# Altium footprint library MS-Electronic.PcbLib: 202 footprints (part 6 of 13)
Each footprint in its own frame and in the unit in brackets; x right, y up, seen from the top. Pads: shape width x height; smd on the part's side, far side on the other; paste and mask are expansions set on the pad; w line width, h text height; cw(c..) or ccw(c..) is an arc to the next point about the centre after c.
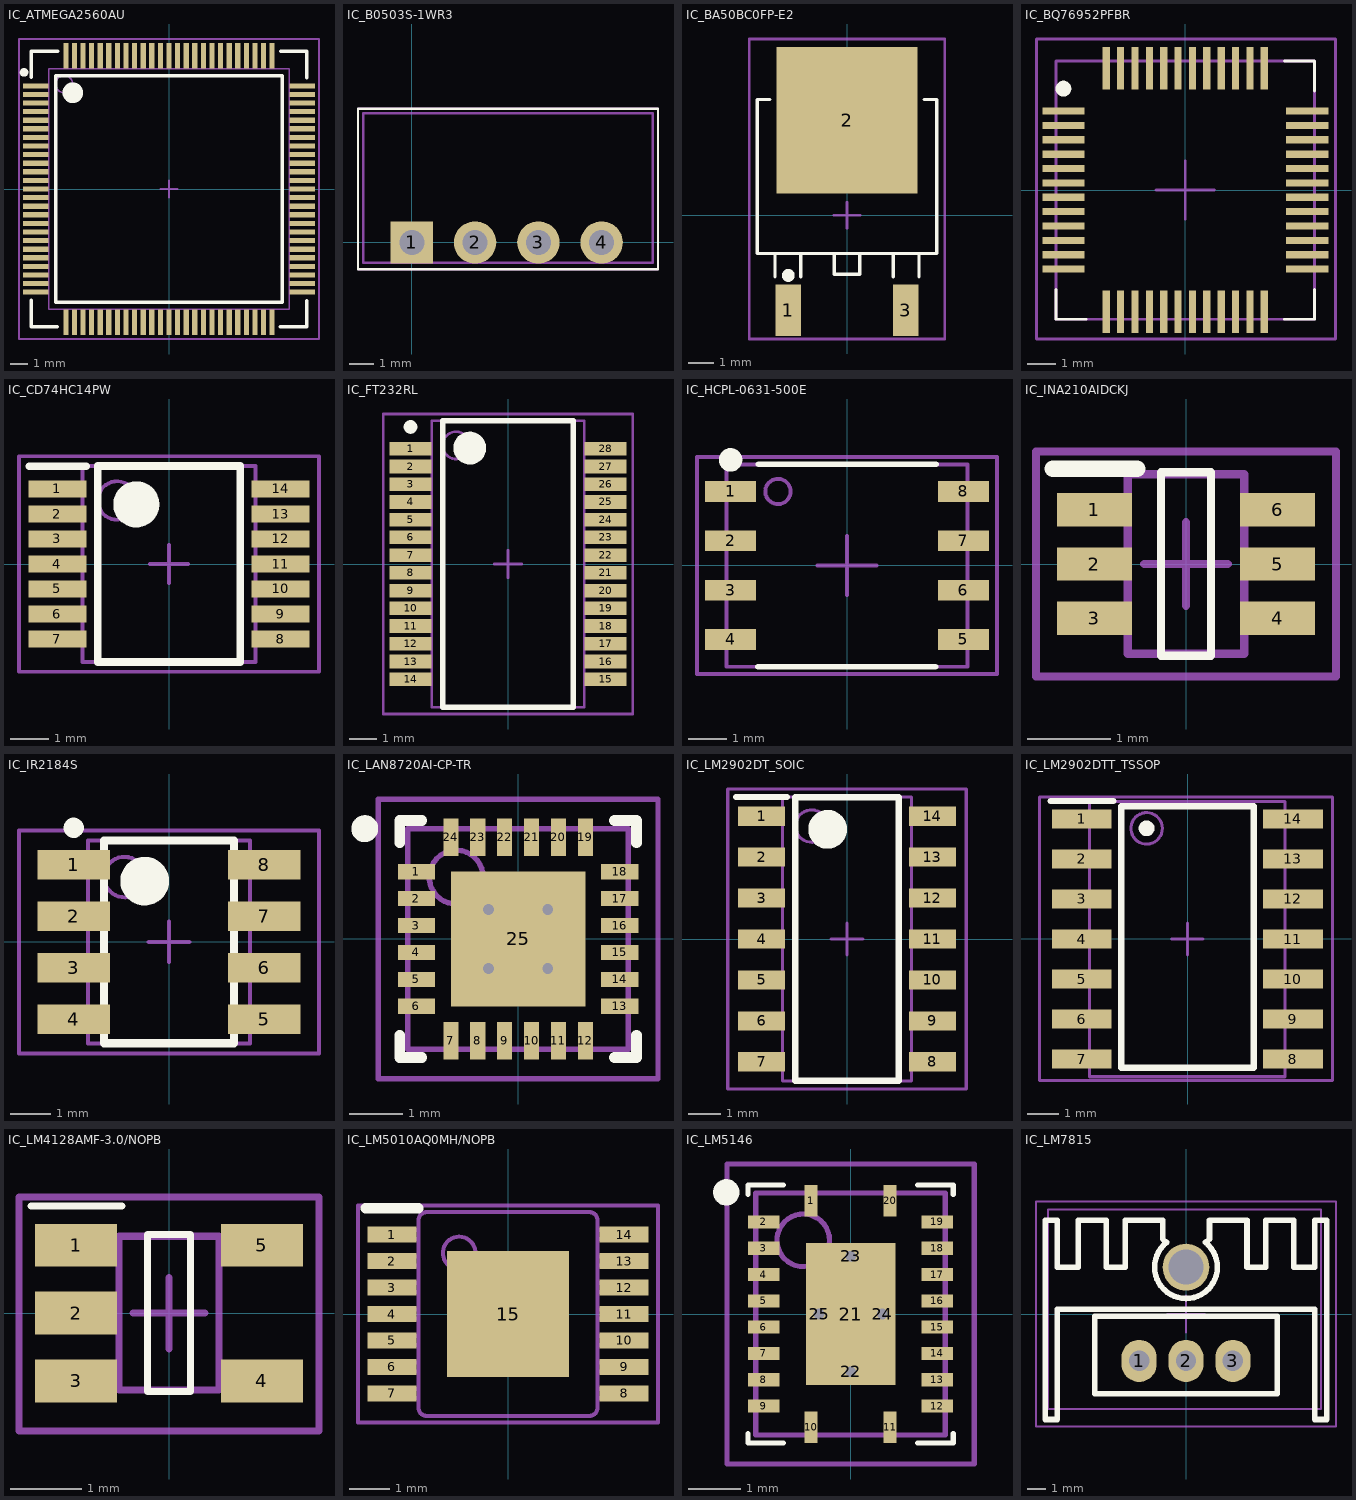
[diagram p5: the footprints below, top view; thin cyan lines are the x and y axes]

## IC_ATMEGA2560AU [mm]
height 1.2
pads (100):
  rect 1.5x0.3 smd: 1(-7.75,6) 2(-7.75,5.5) 3(-7.75,5) 4(-7.75,4.5) 5(-7.75,4) 6(-7.75,3.5) 7(-7.75,3) 8(-7.75,2.5) 9(-7.75,2) 10(-7.75,1.5) 11(-7.75,1) 12(-7.75,0.5) 13(-7.75,0) 14(-7.75,-0.5) 15(-7.75,-1) 16(-7.75,-1.5) 17(-7.75,-2) 18(-7.75,-2.5) 19(-7.75,-3) 20(-7.75,-3.5) 21(-7.75,-4) 22(-7.75,-4.5) 23(-7.75,-5) 24(-7.75,-5.5) 25(-7.75,-6) 51(7.75,-6) 52(7.75,-5.5) 53(7.75,-5) 54(7.75,-4.5) 55(7.75,-4) 56(7.75,-3.5) 57(7.75,-3) 58(7.75,-2.5) 59(7.75,-2) 60(7.75,-1.5) 61(7.75,-1) 62(7.75,-0.5) 63(7.75,0) 64(7.75,0.5) 65(7.75,1) 66(7.75,1.5) 67(7.75,2) 68(7.75,2.5) 69(7.75,3) 70(7.75,3.5) 71(7.75,4) 72(7.75,4.5) 73(7.75,5) 74(7.75,5.5) 75(7.75,6)
  rect 0.3x1.5 smd: 26(-6,-7.75) 27(-5.5,-7.75) 28(-5,-7.75) 29(-4.5,-7.75) 30(-4,-7.75) 31(-3.5,-7.75) 32(-3,-7.75) 33(-2.5,-7.75) 34(-2,-7.75) 35(-1.5,-7.75) 36(-1,-7.75) 37(-0.5,-7.75) 38(0,-7.75) 39(0.5,-7.75) 40(1,-7.75) 41(1.5,-7.75) 42(2,-7.75) 43(2.5,-7.75) 44(3,-7.75) 45(3.5,-7.75) 46(4,-7.75) 47(4.5,-7.75) 48(5,-7.75) 49(5.5,-7.75) 50(6,-7.75) 76(6,7.75) 77(5.5,7.75) 78(5,7.75) 79(4.5,7.75) 80(4,7.75) 81(3.5,7.75) 82(3,7.75) 83(2.5,7.75) 84(2,7.75) 85(1.5,7.75) 86(1,7.75) 87(0.5,7.75) 88(0,7.75) 89(-0.5,7.75) 90(-1,7.75) 91(-1.5,7.75) 92(-2,7.75) 93(-2.5,7.75) 94(-3,7.75) 95(-3.5,7.75) 96(-4,7.75) 97(-4.5,7.75) 98(-5,7.75) 99(-5.5,7.75) 100(-6,7.75)
Top Overlay:
  circle w0.6: c-5.6,5.6 r0.3
  circle w0.25: c-8.433,6.782 r0.125
  lines w0.2: -8.001,-6.477 -8.001,-8.001 -6.502,-8.001 ; -8.001,6.502 -8.001,8.001 -6.477,8.001 ; 6.477,-8.001 8.001,-8.001 8.001,-6.502 ; 6.502,8.001 8.001,8.001 8.001,6.477 ; -6.6,-6.6 6.6,-6.6 6.6,6.6 -6.6,6.6 -6.6,-6.6
Top Assembly:
  circle w0.1: c-6.1,6.1 r0.5
  lines w0.1: -7,-7 7,-7 7,7 -7,7 -7,-7
  text ".Designator" at -4.998,-0.333 h1
Top Component Center (Mech15):
  lines w0.1: -0.5,0 0.5,0 ; 0,-0.5 0,0.5 ; -8.725,-8.725 8.725,-8.725 8.725,8.725 -8.725,8.725 -8.725,-8.725
3D body "IC_ATMEGA2560AU.step": height 1.2, standoff 0, extent -8,-8 8,8

## IC_B0503S-1WR3 [mm]
pads (4):
  rect 1.7x1.7 hole 1: 1(0,0)
  round 1.7 hole 1: 2(2.54,0) 3(5.08,0) 4(7.62,0)
Top Overlay:
  lines w0.1: -2.159,-1.067 9.879,-1.067 9.879,5.359 -2.159,5.359 -2.159,-1.067
Top Assembly:
  lines w0.1: -1.956,-0.813 9.677,-0.813 9.677,5.182 -1.956,5.182 -1.956,-0.813
  text ".Designator" at -2.499,-0.167 h0.5
Top Component Center (Mech15):
  lines w0.1: -0.533,0 0,0 ; 0,-0.533 0,0 ; 0,0.533 0,0 ; 0.533,0 0,0 ; -2.159,-1.067 9.879,-1.067 9.879,5.359 -2.159,5.359 -2.159,-1.067
3D body "DC-DC_B5050S-1W.stp": height 10.16, standoff -4.1, extent -1.939,-0.838 9.661,5.162

## IC_BA50BC0FP-E2 [mm]
pads (3):
  rect 1x2 smd mask+0.07: 1(-2.285,-3.7) 3(2.285,-3.7)
  rect 5.5x5.7 smd mask+0.07: 2(0,3.7)
Top Overlay:
  circle w0.25: c-2.285,-2.35 r0.125
  lines w0.127: -3,4.5 -3.5,4.5 -3.5,-1.5 3.5,-1.5 3.5,4.5 3,4.5 ; -2.8,-2.413 -2.8,-1.5 -1.8,-1.5 -1.8,-2.413 ; 1.8,-2.413 1.8,-1.5 2.8,-1.5 2.8,-2.413 ; -0.5,-2.3 0.5,-2.3 0.5,-1.5 -0.5,-1.5 -0.5,-2.3
Top Assembly:
  text ".Designator" at -2.499,-0.167 h0.5
Top Component Center (Mech15):
  lines w0.1: -0.508,0 0,0 ; 0,-0.508 0,0 ; 0,0.508 0,0 ; 0.508,0 0,0 ; -3.81,-4.826 3.81,-4.826 3.81,6.858 -3.81,6.858 -3.81,-4.826
3D body "DPAK.stp": height 2.31, standoff 0, extent -3.3,-3.951 3.3,5.762

## IC_BQ76952PFBR [mm]
pads (48):
  rect 1.475x0.25 smd mask+0.07: 1(-4.238,2.75) 2(-4.238,2.25) 3(-4.238,1.75) 4(-4.238,1.25) 5(-4.238,0.75) 6(-4.238,0.25) 7(-4.238,-0.25) 8(-4.238,-0.75) 9(-4.238,-1.25) 10(-4.238,-1.75) 11(-4.238,-2.25) 12(-4.238,-2.75) 25(4.238,-2.75) 26(4.238,-2.25) 27(4.238,-1.75) 28(4.238,-1.25) 29(4.238,-0.75) 30(4.238,-0.25) 31(4.238,0.25) 32(4.238,0.75) 33(4.238,1.25) 34(4.238,1.75) 35(4.238,2.25) 36(4.238,2.75)
  rect 0.25x1.475 smd mask+0.07: 13(-2.75,-4.238) 14(-2.25,-4.238) 15(-1.75,-4.238) 16(-1.25,-4.238) 17(-0.75,-4.238) 18(-0.25,-4.238) 19(0.25,-4.238) 20(0.75,-4.238) 21(1.25,-4.238) 22(1.75,-4.238) 23(2.25,-4.238) 24(2.75,-4.238) 37(2.75,4.238) 38(2.25,4.238) 39(1.75,4.238) 40(1.25,4.238) 41(0.75,4.238) 42(0.25,4.238) 43(-0.25,4.238) 44(-0.75,4.238) 45(-1.25,4.238) 46(-1.75,4.238) 47(-2.25,4.238) 48(-2.75,4.238)
Top Overlay:
  circle w0.3: c-4.242,3.531 r0.125
  lines w0.1: -4.496,-3.454 -4.496,-4.496 -3.454,-4.496 ; 3.454,-4.496 4.496,-4.496 4.496,-3.454 ; 3.454,4.496 4.496,4.496 4.496,3.454
Top Assembly:
  lines w0.1: -4.496,-4.496 4.496,-4.496 4.496,4.496 -4.496,4.496 -4.496,-4.496
  text ".Designator" at -2.499,-0.167 h0.5
Top Component Center (Mech15):
  lines w0.1: -1.016,0 0,0 ; 0,-1.016 0,0 ; 0,1.016 0,0 ; 1.016,0 0,0 ; -5.182,-5.182 5.232,-5.182 5.232,5.258 -5.182,5.258 -5.182,-5.182
3D body "STM32G431C6T6.stp": height 1.6, standoff 0, extent -4.5,-4.5 4.5,4.5

## IC_CD74HC14PW [mm]
height 1.2
pads (14):
  rect 1.5x0.45 smd: 1(-2.9,1.95) 2(-2.9,1.3) 3(-2.9,0.65) 4(-2.9,0) 5(-2.9,-0.65) 6(-2.9,-1.3) 7(-2.9,-1.95) 8(2.9,-1.95) 9(2.9,-1.3) 10(2.9,-0.65) 11(2.9,0) 12(2.9,0.65) 13(2.9,1.3) 14(2.9,1.95)
Top Overlay:
  circle w0.6: c-0.85,1.55 r0.3
  lines w0.2: -3.632,2.54 -2.159,2.54 ; -1.85,-2.55 1.85,-2.55 1.85,2.55 -1.85,2.55 -1.85,-2.55
Top Assembly:
  circle w0.1: c-1.35,1.65 r0.5
  lines w0.1: -2.25,-2.55 2.25,-2.55 2.25,2.55 -2.25,2.55 -2.25,-2.55
  text ".Designator" at -2.499,-0.167 h0.5
Top Component Center (Mech15):
  lines w0.1: -0.5,0 0.5,0 ; 0,-0.5 0,0.5 ; -3.9,-2.8 3.9,-2.8 3.9,2.8 -3.9,2.8 -3.9,-2.8
3D body "IC_CD74HC14PW.step": height 1.2, standoff 0, extent -3.2,-2.55 3.2,2.55

## IC_FT232RL [mm]
height 2
pads (28):
  rect 1.55x0.5 smd: 1(-3.575,4.225) 2(-3.575,3.575) 3(-3.575,2.925) 4(-3.575,2.275) 5(-3.575,1.625) 6(-3.575,0.975) 7(-3.575,0.325) 8(-3.575,-0.325) 9(-3.575,-0.975) 10(-3.575,-1.625) 11(-3.575,-2.275) 12(-3.575,-2.925) 13(-3.575,-3.575) 14(-3.575,-4.225) 15(3.575,-4.225) 16(3.575,-3.575) 17(3.575,-2.925) 18(3.575,-2.275) 19(3.575,-1.625) 20(3.575,-0.975) 21(3.575,-0.325) 22(3.575,0.325) 23(3.575,0.975) 24(3.575,1.625) 25(3.575,2.275) 26(3.575,2.925) 27(3.575,3.575) 28(3.575,4.225)
Top Overlay:
  circle w0.25: c-3.575,5.025 r0.125
  circle w0.6: c-1.4,4.25 r0.3
  lines w0.2: -2.4,-5.25 -2.4,5.25 2.4,5.25 2.4,-5.25 -2.4,-5.25
Top Assembly:
  circle w0.1: c-1.9,4.35 r0.5
  lines w0.1: -2.8,-5.25 -2.8,5.25 2.8,5.25 2.8,-5.25 -2.8,-5.25
  text ".Designator" at -3.999,-0.267 h0.8
Top Component Center (Mech15):
  lines w0.1: -0.5,0 0.5,0 ; 0,-0.5 0,0.5 ; -4.575,-5.5 -4.575,5.5 4.575,5.5 4.575,-5.5 -4.575,-5.5
3D body "IC_FT232RL.step": height 2, standoff 0, extent -3.888,-5.25 3.888,5.25

## IC_HCPL-0631-500E [mil]
pads (8):
  rect 52x21 smd paste+0: 1(-118,75) 2(-118,25) 3(-118,-25) 4(-118,-75) 5(118,-75) 6(118,-25) 7(118,25) 8(118,75)
Top Overlay:
  circle w11.81: c-118,107 r6.01
  lines w6: -90.34,-102.61 89.79,-102.61 ; -89.79,102.61 90.34,102.61
Top Assembly:
  circle w3.94: c-70,75 r12.81
  lines w3.94: -121.99,-102.61 122.04,-102.61 122.04,102.51 -121.99,102.51 -121.99,-102.61
  text ".Designator" at -157.43,-10.5 h31.5
Top Component Center (Mech15):
  lines w3.94: -30,0 0,0 ; 0,-30 0,0 ; 0,30 0,0 ; 30,0 0,0 ; -152,-110 152,-110 152,110 -152,110 -152,-110
3D body "SO8_HCPL-0631_BRA.step": height 130.12, standoff 0, extent -122.01,-102.52 122.01,102.52

## IC_INA210AIDCKJ [mm]
height 1.1
pads (6):
  rect 0.9x0.4 smd: 1(-1.1,0.65) 2(-1.1,0) 3(-1.1,-0.65) 4(1.1,-0.65) 5(1.1,0) 6(1.1,0.65)
Top Overlay:
  lines w0.1: -0.3,-1.1 0.3,-1.1 0.3,1.1 -0.3,1.1 -0.3,-1.1
  lines w0.2: -1.6,1.143 -0.584,1.143
Top Assembly:
  lines w0.1: -0.7,-1.075 -0.7,1.075 0.7,1.075 0.7,-1.075 -0.7,-1.075
  text ".Designator" at -2.499,-0.167 h0.5
Top Component Center (Mech15):
  lines w0.1: -0.5,0 0.5,0 ; 0,-0.5 0,0.5 ; -1.8,-1.35 -1.8,1.35 1.8,1.35 1.8,-1.35 -1.8,-1.35
3D body "IC_INA210AIDCKJ.step": height 1.1, standoff 0, extent -1.2,-1.075 1.2,1.075

## IC_IR2184S [mm]
height 1.75
pads (8):
  rect 1.78x0.72 smd: 1(-2.35,1.905) 2(-2.35,0.635) 3(-2.35,-0.635) 4(-2.35,-1.905) 5(2.35,-1.905) 6(2.35,-0.635) 7(2.35,0.635) 8(2.35,1.905)
Top Overlay:
  circle w0.25: c-2.35,2.815 r0.125
  circle w0.6: c-0.6,1.5 r0.3
  lines w0.2: -1.6,-2.5 -1.6,2.5 1.6,2.5 1.6,-2.5 -1.6,-2.5
Top Assembly:
  circle w0.1: c-1.1,1.6 r0.5
  lines w0.1: -2,-2.5 -2,2.5 2,2.5 2,-2.5 -2,-2.5
  text ".Designator" at -3.999,-0.267 h0.8
Top Component Center (Mech15):
  lines w0.1: -0.5,0 0.5,0 ; 0,-0.5 0,0.5 ; -3.7,-2.75 -3.7,2.75 3.7,2.75 3.7,-2.75 -3.7,-2.75
3D body "IC_IR2184S.step": height 1.75, standoff 0, extent -3,-2.5 3,2.5

## IC_LAN8720AI-CP-TR [mm]
height 1
pads (25):
  rect 0.69x0.28 smd: 1(-1.89,1.25) 2(-1.89,0.75) 3(-1.89,0.25) 4(-1.89,-0.25) 5(-1.89,-0.75) 6(-1.89,-1.25) 13(1.89,-1.25) 14(1.89,-0.75) 15(1.89,-0.25) 16(1.89,0.25) 17(1.89,0.75) 18(1.89,1.25)
  rect 0.28x0.69 smd: 7(-1.25,-1.89) 8(-0.75,-1.89) 9(-0.25,-1.89) 10(0.25,-1.89) 11(0.75,-1.89) 12(1.25,-1.89) 19(1.25,1.89) 20(0.75,1.89) 21(0.25,1.89) 22(-0.25,1.89) 23(-0.75,1.89) 24(-1.25,1.89)
  rect 2.5x2.5 smd: 25(0,0)
via -0.55,0.55 diameter 0.5 hole 0.2
via 0.55,0.55 diameter 0.5 hole 0.2
via -0.55,-0.55 diameter 0.5 hole 0.2
via 0.55,-0.55 diameter 0.5 hole 0.2
Top Overlay:
  circle w0.25: c-2.85,2.05 r0.125
  lines w0.2: -2.2,-1.79 -2.2,-2.2 -1.79,-2.2 ; -2.2,1.79 -2.2,2.2 -1.79,2.2 ; 1.79,-2.2 2.2,-2.2 2.2,-1.79 ; 1.79,2.2 2.2,2.2 2.2,1.79
Top Assembly:
  circle w0.1: c-1.15,1.15 r0.5
  lines w0.1: -2.05,-2.05 -2.05,2.05 2.05,2.05 2.05,-2.05 -2.05,-2.05
  text ".Designator" at -2.999,-0.2 h0.6
Top Component Center (Mech15):
  lines w0.1: -0.5,0 0.5,0 ; 0,-0.5 0,0.5 ; -2.6,-2.6 -2.6,2.6 2.6,2.6 2.6,-2.6 -2.6,-2.6
3D body "IC_LAN8720AI-CP-TR.step": height 1, standoff 0, extent -2.051,-2.051 2.051,2.051

## IC_LM2902DT_SOIC [mm]
height 1.75
pads (14):
  rect 1.45x0.6 smd: 1(-2.65,3.81) 2(-2.65,2.54) 3(-2.65,1.27) 4(-2.65,0) 5(-2.65,-1.27) 6(-2.65,-2.54) 7(-2.65,-3.81) 8(2.65,-3.81) 9(2.65,-2.54) 10(2.65,-1.27) 11(2.65,0) 12(2.65,1.27) 13(2.65,2.54) 14(2.65,3.81)
Top Overlay:
  circle w0.6: c-0.6,3.4 r0.3
  lines w0.2: -3.429,4.401 -1.87,4.401 ; -1.6,-4.4 1.6,-4.4 1.6,4.4 -1.6,4.4 -1.6,-4.4
Top Assembly:
  circle w0.1: c-1.1,3.5 r0.5
  lines w0.1: -2,-4.4 2,-4.4 2,4.4 -2,4.4 -2,-4.4
  text ".Designator" at -2.499,-0.167 h0.5
Top Component Center (Mech15):
  lines w0.1: -0.5,0 0.5,0 ; 0,-0.5 0,0.5 ; -3.7,-4.65 3.7,-4.65 3.7,4.65 -3.7,4.65 -3.7,-4.65
3D body "IC_LM2902DT.step": height 1.75, standoff 0, extent -3,-4.4 3,4.4

## IC_LM2902DTT_TSSOP [mm]
pads (14):
  rect 1.9x0.6 smd mask+0.07: 1(-3.357,3.799) 2(-3.357,2.529) 3(-3.357,1.259) 4(-3.357,-0.011) 5(-3.357,-1.281) 6(-3.357,-2.551) 7(-3.357,-3.821) 8(3.343,-3.821) 9(3.343,-2.551) 10(3.343,-1.281) 11(3.343,-0.011) 12(3.343,1.259) 13(3.343,2.529) 14(3.343,3.799)
Top Overlay:
  circle w0.25: c-1.3,3.5 r0.125
  lines w0.2: -4.343,4.369 -2.362,4.369 ; -2.1,-4.1 2.1,-4.1 2.1,4.2 -2.1,4.2 -2.1,-4.1
Top Assembly:
  circle w0.1: c-1.3,3.5 r0.5
  lines w0.1: -3.11,-4.384 3.095,-4.384 3.095,4.355 -3.11,4.355 -3.11,-4.384
  text ".Designator" at -2.506,-0.178 h0.5
Top Component Center (Mech15):
  lines w0.1: -0.507,-0.011 0.493,-0.011 ; -0.007,-0.511 -0.007,0.489 ; -4.7,-4.5 4.6,-4.5 4.6,4.5 -4.7,4.5 -4.7,-4.5
3D body "D14-M.stp": height 1.76, standoff 0, extent -3.106,-4.38 3.092,4.358

## IC_LM4128AMF-3.0/NOPB [mm]
height 1.1
pads (5):
  rect 1.15x0.6 smd: 1(-1.3,0.95) 2(-1.3,0) 3(-1.3,-0.95) 4(1.3,-0.95) 5(1.3,0.95)
Top Overlay:
  lines w0.1: -1.93,1.499 -0.66,1.499 ; -0.3,-1.1 0.3,-1.1 0.3,1.1 -0.3,1.1 -0.3,-1.1
Top Assembly:
  lines w0.1: -0.7,-1.075 -0.7,1.075 0.7,1.075 0.7,-1.075 -0.7,-1.075
  text ".Designator" at -2.999,-0.2 h0.6
Top Component Center (Mech15):
  lines w0.1: -0.5,0 0.5,0 ; 0,-0.5 0,0.5 ; -2.1,-1.651 -2.1,1.626 2.1,1.626 2.1,-1.651 -2.1,-1.651
3D body "SOT23-5_STM.step": height 1.45, standoff 0, extent -1.499,-1.499 1.499,1.499

## IC_LM5010AQ0MH/NOPB [mm]
pads (15):
  rect 1.2x0.4 smd mask+0.07: 1(-2.85,1.95) 2(-2.85,1.3) 3(-2.85,0.65) 4(-2.85,0) 5(-2.85,-0.65) 6(-2.85,-1.3) 7(-2.85,-1.95) 8(2.85,-1.95) 9(2.85,-1.3) 10(2.85,-0.65) 11(2.85,0) 12(2.85,0.65) 13(2.85,1.3) 14(2.85,1.95)
  rect 3x3.1 smd: 15(0,0)
Top Overlay:
  lines w0.254: -3.5,2.6 -2.2,2.6
Top Assembly:
  lines w0.1: -2.2,-2.06 -3.209,-2.06 -3.209,-1.84 -2.2,-1.84 ; -2.2,-1.41 -3.209,-1.41 -3.209,-1.19 -2.2,-1.19 ; -2.2,-0.76 -3.209,-0.76 -3.209,-0.54 -2.2,-0.54 ; -2.2,-0.11 -3.209,-0.11 -3.209,0.11 -2.2,0.11 ; -2.2,0.54 -3.209,0.54 -3.209,0.76 -2.2,0.76 ; -2.2,1.19 -3.209,1.19 -3.209,1.41 -2.2,1.41 ; -2.2,1.84 -3.209,1.84 -3.209,2.06 -2.2,2.06 ; 2.2,-2.06 3.209,-2.06 3.209,-1.84 2.2,-1.84 ; 2.2,-1.41 3.209,-1.41 3.209,-1.19 2.2,-1.19 ; 2.2,-0.76 3.209,-0.76 3.209,-0.54 2.2,-0.54 ; 2.2,-0.11 3.209,-0.11 3.209,0.11 2.2,0.11 ; 2.2,0.54 3.209,0.54 3.209,0.76 2.2,0.76 ; 2.2,1.19 3.209,1.19 3.209,1.41 2.2,1.41 ; 2.2,1.84 3.209,1.84 3.209,2.06 2.2,2.06 ; -2.2,-2.3 ccw(c-2,-2.3) -2,-2.5 2,-2.5 ccw(c2,-2.3) 2.2,-2.3 2.2,2.3 ccw(c2,2.3) 2,2.5 -2,2.5 ccw(c-2,2.3) -2.2,2.3 -2.2,-2.3 ; -1.2,1.1 ccw(c-1.2,1.5) -1.2,1.9 ccw(c-1.2,1.5) -1.2,1.1
  text ".Designator" at -2.499,-0.167 h0.5
Top Component Center (Mech15):
  lines w0.1: -0.762,0 0,0 ; 0,-0.762 0,0 ; 0,0.762 0,0 ; 0.762,0 0,0 ; -3.683,-2.667 3.683,-2.667 3.683,2.667 -3.683,2.667 -3.683,-2.667
3D body "PWP0014A.stp": height 1, standoff 0, extent -3.21,-2.5 3.21,2.5

## IC_LM5146 [mm]
height 1
pads (25):
  rect 0.25x0.6 smd: 1(-0.75,2.15) 10(-0.75,-2.15) 11(0.75,-2.15) 20(0.75,2.15)
  rect 0.6x0.25 smd: 2(-1.65,1.75) 3(-1.65,1.25) 4(-1.65,0.75) 5(-1.65,0.25) 6(-1.65,-0.25) 7(-1.65,-0.75) 8(-1.65,-1.25) 9(-1.65,-1.75) 12(1.65,-1.75) 13(1.65,-1.25) 14(1.65,-0.75) 15(1.65,-0.25) 16(1.65,0.25) 17(1.65,0.75) 18(1.65,1.25) 19(1.65,1.75)
  rect 1.7x2.7 smd: 21(0,0)
  round 0.5 / inner round 1.524 / far side round 0.5 hole 0.203 paste-2539.97 mask+0: 22(0,-1.1) 23(0,1.1) 24(0.6,0) 25(-0.6,0)
Top Overlay:
  circle w0.25: c-2.362,2.311 r0.125
  lines w0.1: -1.95,-2.275 -1.95,-2.45 -1.275,-2.45 ; -1.95,2.275 -1.95,2.45 -1.275,2.45 ; 1.275,-2.45 1.95,-2.45 1.95,-2.275 ; 1.275,2.45 1.95,2.45 1.95,2.275
Top Assembly:
  circle w0.1: c-0.9,1.4 r0.5
  lines w0.1: -1.8,-2.3 1.8,-2.3 1.8,2.3 -1.8,2.3 -1.8,-2.3
  text ".Designator" at -2.499,-0.167 h0.5
Top Component Center (Mech15):
  lines w0.1: -0.5,0 0.5,0 ; 0,-0.5 0,0.5 ; -2.35,-2.85 2.35,-2.85 2.35,2.85 -2.35,2.85 -2.35,-2.85
3D body "IC_LM5146.step": height 1, standoff 0, extent -1.801,-2.301 1.801,2.301

## IC_LM7815 [mm]
pads (4):
  oval 1.9x2.286 hole 1.1: 1(-2.54,-2.54) 2(0,-2.54) 3(2.54,-2.54)
  round 2.54 hole 1.905: ""(0,2.54)
Top Overlay:
  lines w0.305: -1.065,3.859 -1.27,4.064 -1.27,5.08 -3.302,5.08 -3.302,2.54 -4.318,2.54 -4.318,5.08 -5.842,5.08 -5.842,2.54 -6.985,2.54 -6.985,5.08 -7.62,5.08 -7.62,-5.715 -6.985,-5.715 -6.985,0.254 6.985,0.254 6.985,-5.715 7.62,-5.715 7.62,5.08 6.985,5.08 6.985,2.54 5.842,2.54 5.842,5.08 4.318,5.08 4.318,2.54 3.302,2.54 3.302,5.08 1.27,5.08 1.27,4.064 1.066,3.86 ; -1.039,3.885 ccw(c0,2.54) 1.044,3.882 ; -4.953,-4.318 4.953,-4.318 4.953,-0.127 -4.953,-0.127 -4.953,-4.318
Top Assembly:
  lines w0.1: -7.473,-5.141 7.317,-5.141 7.317,5.665 -7.473,5.665 -7.473,-5.141
  text ".Designator" at -4.998,-0.333 h1
Top Component Center (Mech15):
  lines w0.1: -1.016,0 0,0 ; 0,-1.016 0,0 ; 0,1.016 0,0 ; 1.016,0 0,0 ; -8.128,-6.096 8.128,-6.096 8.128,6.096 -8.128,6.096 -8.128,-6.096
3D body "User Library-TO-220-1.STEP": height 8.2, standoff -20.58, extent -4.95,-4.623 4.95,-0.123
3D body "SW3dPS-heatsink TO126.STEP": height 25, standoff -3.8, extent -7.465,-5.137 7.316,5.664